# Altium footprint library connectors.PcbLib: 256 footprints (part 12 of 16)
Each footprint in its own frame and in the unit in brackets; x right, y up, seen from the top. Pads: shape width x height; smd on the part's side, far side on the other; paste and mask are expansions set on the pad; w line width, h text height; cw(c..) or ccw(c..) is an arc to the next point about the centre after c.
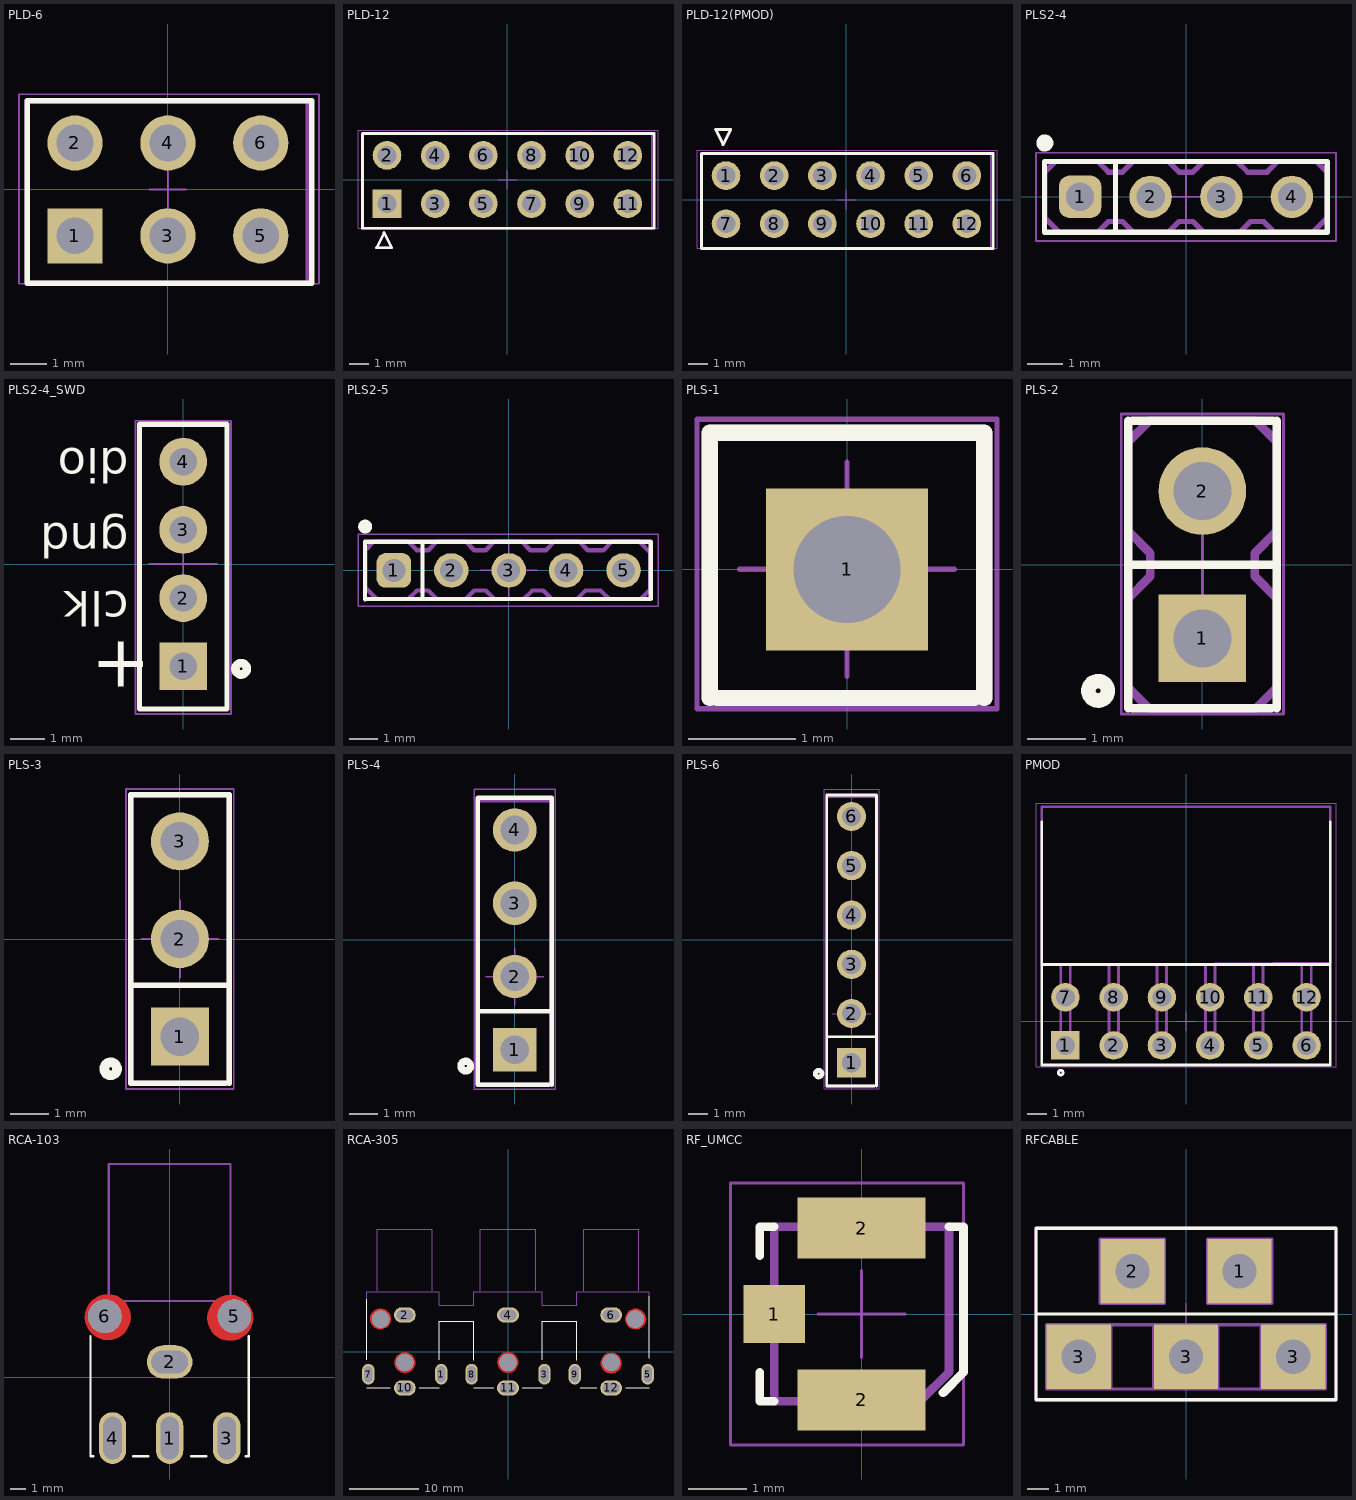
[diagram p11: the footprints below, top view; thin cyan lines are the x and y axes]

## PLD-6 [mm] "Разъем"
height 5
pads (6):
  rect 1.51x1.51 hole 1: 1(-2.54,-1.27)
  round 1.51 hole 1: 2(-2.54,1.27) 3(0,-1.27) 4(0,1.27) 5(2.54,-1.27) 6(2.54,1.27)
Top Overlay:
  lines w0.15: -3.84,-2.57 -3.84,2.43 3.93,2.43 3.93,-2.57 -3.84,-2.57
TopAssy 13:
  lines w0.15: -3.84,-2.57 3.83,-2.57 3.83,2.43 -3.84,2.43 -3.84,-2.57 ; -2.945,-1.675 -2.945,-0.875 -2.17,-0.875 -2.17,-1.675 -2.945,-1.675
TopCourt 15:
  lines w0.05: -0.5,0 0.5,0 ; 0,-0.5 0,0.5 ; -4.07,-2.575 -4.07,2.6 4.13,2.6 4.13,-2.575 -4.07,-2.575
3D body "PLD4.STEP": height 10.1, standoff -1.5, extent -1.27,-2.54 3.81,2.54
3D body "PLD4.STEP": height 10.1, standoff -1.5, extent -3.81,-2.54 1.27,2.54

## PLD-12 [mm] "Разъем"
height 5
pads (12):
  rect 1.51x1.51 hole 1: 1(-6.35,-1.27)
  round 1.51 hole 1: 2(-6.35,1.27) 3(-3.81,-1.27) 4(-3.81,1.27) 5(-1.27,-1.27) 6(-1.27,1.27) 7(1.27,-1.27) 8(1.27,1.27) 9(3.81,-1.27) 10(3.81,1.27) 11(6.35,-1.27) 12(6.35,1.27)
Top Overlay:
  lines w0.15: -7.65,-2.57 -7.65,2.43 7.74,2.43 7.74,-2.57 -7.65,-2.57 ; -6.9,-3.6 -6.5,-2.8 -6.1,-3.6 -6.9,-3.6
TopAssy 13:
  lines w0.15: -7.65,-2.57 7.64,-2.57 7.64,2.43 -7.65,2.43 -7.65,-2.57 ; -6.9,-3.6 -6.5,-2.8 -6.1,-3.6 -6.9,-3.6 ; -6.755,-1.675 -6.755,-0.875 -5.98,-0.875 -5.98,-1.675 -6.755,-1.675
TopCourt 15:
  lines w0.05: -0.5,0 0.5,0 ; 0,-0.5 0,0.5 ; -7.88,-2.575 -7.88,2.6 7.94,2.6 7.94,-2.575 -7.88,-2.575
3D body "PLD-12-2.54mm.STEP": height 8.54, standoff -3, extent -7.62,-2.54 7.62,2.54

## PLD-12(PMOD) [mm] "Разъем"
height 5
pads (12):
  round 1.51 hole 1: 1(-6.35,1.27) 2(-3.81,1.27) 3(-1.27,1.27) 4(1.27,1.27) 5(3.81,1.27) 6(6.35,1.27) 7(-6.35,-1.27) 8(-3.81,-1.27) 9(-1.27,-1.27) 10(1.27,-1.27) 11(3.81,-1.27) 12(6.35,-1.27)
Top Overlay:
  lines w0.15: -7.65,-2.57 7.74,-2.57 7.74,2.43 -7.65,2.43 -7.65,-2.57 ; -6.9,3.7 -6.1,3.7 -6.5,2.9 -6.9,3.7
TopAssy 13:
  lines w0.15: -7.65,-2.57 -7.65,2.43 7.64,2.43 7.64,-2.57 -7.65,-2.57 ; -6.9,3.7 -6.1,3.7 -6.5,2.9 -6.9,3.7 ; -6.755,-1.675 -5.98,-1.675 -5.98,-0.875 -6.755,-0.875 -6.755,-1.675
TopCourt 15:
  lines w0.05: -0.5,0 0.5,0 ; 0,-0.5 0,0.5 ; -7.88,-2.575 7.94,-2.575 7.94,2.6 -7.88,2.6 -7.88,-2.575
3D body "PLD-12-2.54mm.STEP": height 8.54, standoff -3, extent -7.62,-2.54 7.62,2.54

## PLS2-4 [mm]
height 2.1
pads (4):
  rrect50% 1.2x1.2 hole 0.8: 1(-3,0)
  round 1.2 hole 0.8: 2(-1,0) 3(1,0) 4(3,0)
Top Overlay:
  circle w0.15: c-4,1.525 r0.079
  circle w0.15: c-4,1.525 r0.168
  lines w0.15: -4.008,-1.008 -4.008,0.992 ; -4.008,-1 4,-1 4,1 -4.008,1 ; -2,-1 -2,1 -2.05,1 -1.975,1
TopAssy 13:
  lines w0.15: -4,-0.6 -3.6,-1 -2.5,-1 -2.2,-0.7 -1.8,-0.7 -1.5,-1 -0.5,-1 -0.2,-0.7 0.2,-0.7 0.5,-1 1.525,-1 1.825,-0.7 2.2,-0.7 2.5,-1 3.6,-1 4,-0.6 4,0.7 3.7,1 2.6,1 2.3,0.7 1.75,0.7 1.45,1 0.5,1 0.2,0.7 -0.2,0.7 -0.5,1 -1.5,1 -1.8,0.7 -2.2,0.7 -2.5,1 -3.7,1 -4,0.7 -4,-0.6 ; -3.2,-0.2 -2.8,-0.2 -2.8,0.2 -3.2,0.2 -3.2,-0.2 ; -1.2,-0.2 -0.8,-0.2 -0.8,0.2 -1.2,0.2 -1.2,-0.2 ; 0.8,-0.2 1.2,-0.2 1.2,0.2 0.8,0.2 0.8,-0.2 ; 2.8,-0.2 3.2,-0.2 3.2,0.2 2.8,0.2 2.8,-0.2
TopCourt 15:
  lines w0.05: -1,0 1,0 ; 0,-1 0,1 ; -4.25,-1.25 -4.25,1.25 4.25,1.25 4.25,-1.25 -4.25,-1.25
3D body "User Library-pls2-4_asm.STEP": height 6.1, standoff -2.7, extent -4,-1 4,1

## PLS2-4_SWD [mm]
pads (4):
  rect 1.4x1.4 hole 0.8: 1(0,-3)
  round 1.4 hole 0.8: 2(0,-1) 3(0,1) 4(0,3)
Top Overlay:
  circle w0.25: c1.7,-3.075 r0.168
  lines w0.15: -1.281,-4.25 1.281,-4.25 1.281,4.1 -1.281,4.1 -1.281,-4.25
  text "clk" at -1.6,-0.8 h1
  text "dio" at -1.6,3.4 h1
  text "gnd" at -1.6,1.2 h1
  text "+" at -2.7,-3.6 h1.52
TopAssy 13:
TopCourt 15:
  lines w0.05: -1,0 1,0 ; 0,-1 0,1 ; -1.4,-4.4 1.4,-4.4 1.4,4.2 -1.4,4.2 -1.4,-4.4
3D body "User Library-pls2-4_asm.STEP": height 6, standoff -2.8, extent -1,-4 1,4

## PLS2-5 [mm]
height 2.1
pads (5):
  rrect50% 1.2x1.2 hole 0.8: 1(-4,0)
  round 1.2 hole 0.8: 2(-2,0) 3(0,0) 4(2,0) 5(4,0)
Top Overlay:
  circle w0.15: c-5,1.525 r0.079
  circle w0.15: c-5,1.525 r0.168
  lines w0.15: -5.008,-1.008 -5.008,0.992 ; -5.008,-1 4.95,-1 4.95,1 -5.008,1 ; -3,-1 -3,1 -3.05,1 -2.975,1
TopAssy 13:
  lines w0.15: -5,-0.6 -4.6,-1 -3.5,-1 -3.2,-0.7 -2.8,-0.7 -2.5,-1 -1.5,-1 -1.2,-0.7 -0.8,-0.7 -0.5,-1 0.525,-1 0.825,-0.7 1.2,-0.7 1.5,-1 2.375,-1 2.675,-0.7 3.2,-0.7 3.5,-1 4.6,-1 4.925,-0.675 4.925,0.625 4.55,1 3.6,1 3.3,0.7 2.75,0.7 2.45,1 1.6,1 1.3,0.7 0.75,0.7 0.45,1 -0.5,1 -0.8,0.7 -1.2,0.7 -1.5,1 -2.5,1 -2.8,0.7 -3.2,0.7 -3.5,1 -4.7,1 -5,0.7 -5,-0.6 ; -4.2,-0.2 -3.8,-0.2 -3.8,0.2 -4.2,0.2 -4.2,-0.2 ; -2.2,-0.2 -1.8,-0.2 -1.8,0.2 -2.2,0.2 -2.2,-0.2 ; -0.2,-0.2 0.2,-0.2 0.2,0.2 -0.2,0.2 -0.2,-0.2 ; 1.8,-0.2 2.2,-0.2 2.2,0.2 1.8,0.2 1.8,-0.2 ; 3.8,-0.2 3.8,0.2 4.2,0.2 4.2,-0.2 3.8,-0.2
TopCourt 15:
  lines w0.05: -1,0 1,0 ; 0,-1 0,1 ; -5.25,-1.25 -5.25,1.25 5.2,1.25 5.2,-1.25 -5.25,-1.25
3D body "User Library-pls2-5_asm-1.STEP": height 6.1, standoff -2.7, extent -5,-1 5,1

## PLS-1 [mm]
pads (1):
  rect 1.51x1.51 hole 1: 1(0,0)
Top Overlay:
  lines w0.15: -1.281,-1.2 -1.281,1.275 1.281,1.275 1.281,-1.2 ; -1.211,-1.2 1.184,-1.2
TopAssy 13:
  lines w0.15: -1.281,-1.2 -1.281,1.275 1.281,1.275 1.281,-1.2 -1.281,-1.2 ; -0.5,-0.425 0.275,-0.425 0.275,0.375 -0.5,0.375 -0.5,-0.425
TopCourt 15:
  lines w0.05: -1,0 1,0 ; 0,-1 0,1 ; -1.4,-1.3 1.4,-1.3 1.4,1.4 -1.4,1.4 -1.4,-1.3
3D body "User Library-PLS-1.step": height 8.54, standoff -2.9, extent -1.27,-1.27 1.27,1.27

## PLS-2 [mm]
pads (2):
  rect 1.51x1.51 hole 1: 1(0,-1.27)
  round 1.51 hole 1: 2(0,1.27)
Top Overlay:
  circle w0.25: c-1.8,-2.175 r0.168
  lines w0.15: -1.281,-2.475 -1.281,2.485 ; -1.211,-2.475 1.184,-2.475 ; -1.211,0 1.221,0 ; -1.211,2.485 1.221,2.485 ; 1.281,-2.475 1.281,2.485
TopAssy 13:
  lines w0.15: -1.281,-2.119 -0.925,-2.475 0.925,-2.475 1.281,-2.119 1.281,-0.581 0.9,-0.2 0.9,0.2 1.281,0.581 1.281,2.119 0.915,2.485 -0.915,2.485 -1.281,2.119 -1.281,0.581 -0.9,0.2 -0.9,-0.2 -1.281,-0.581 -1.281,-2.119 ; -0.2,-1.5 0.2,-1.5 0.2,-1.1 -0.2,-1.1 -0.2,-1.5 ; -0.2,1.1 -0.2,1.5 0.2,1.5 0.2,1.1 -0.2,1.1
TopCourt 15:
  lines w0.05: -1,0 1,0 ; 0,-1 0,1 ; -1.4,-2.575 1.4,-2.575 1.4,2.6 -1.4,2.6 -1.4,-2.575
3D body "User Library-PLS-2.step": height 8.64, standoff -2.9, extent -1.29,-2.54 1.25,2.54

## PLS-3 [mm]
pads (3):
  rect 1.51x1.51 hole 1: 1(0,-2.54)
  round 1.51 hole 1: 2(0,0) 3(0,2.54)
Top Overlay:
  circle w0.25: c-1.8,-3.375 r0.168
  lines w0.15: -1.281,-3.75 -1.281,3.75 1.221,3.75 ; -1.281,-1.2 1.281,-1.2 ; -1.211,-3.75 1.184,-3.75 ; 1.281,-3.75 1.281,3.75
TopAssy 13:
  lines w0.15: -1.281,-3.75 -1.281,3.75 ; -1.211,-3.75 1.184,-3.75 ; -1.211,3.75 1.221,3.75 ; 1.281,-3.75 1.281,3.75 ; -0.4,-2.925 0.375,-2.925 0.375,-2.125 -0.4,-2.125 -0.4,-2.925
TopCourt 15:
  lines w0.05: -1,0 1,0 ; 0,-1 0,1 ; -1.4,-3.9 -1.4,3.9 1.4,3.9 1.4,-3.9 -1.4,-3.9
3D body "PLS3.STEP": height 10.1, standoff -1.5, extent -1.27,-3.77 1.27,3.85

## PLS-4 [mm]
pads (4):
  rect 1.51x1.51 hole 1: 1(0,-3.81)
  round 1.51 hole 1: 2(0,-1.27) 3(0,1.27) 4(0,3.81)
Top Overlay:
  circle w0.25: c-1.7,-4.375 r0.168
  lines w0.15: -1.281,-5.02 -1.281,4.93 1.281,4.93 1.281,-5.02 ; -1.281,-2.47 1.281,-2.47 ; -1.211,-5.02 1.184,-5.02
TopAssy 13:
  lines w0.15: -1.281,-5.02 -1.281,4.83 1.281,4.83 1.281,-5.02 ; -1.211,-5.02 1.184,-5.02 ; -0.4,-4.195 0.375,-4.195 0.375,-3.395 -0.4,-3.395 -0.4,-4.195
TopCourt 15:
  lines w0.05: -1,-1.27 1,-1.27 ; 0,-2.27 0,-0.27 ; -1.4,-5.17 -1.4,5.23 1.4,5.23 1.4,-5.17 -1.4,-5.17
3D body "User Library-PLS-1.step": height 8.54, standoff -2.9, extent -1.27,2.54 1.27,5.08
3D body "User Library-PLS-1.step": height 8.54, standoff -2.9, extent -1.27,0 1.27,2.54
3D body "User Library-PLS-1.step": height 8.54, standoff -2.9, extent -1.27,-2.54 1.27,0
3D body "User Library-PLS-1.step": height 8.54, standoff -2.9, extent -1.27,-5.08 1.27,-2.54

## PLS-6 [mm]
pads (6):
  rect 1.51x1.51 hole 1: 1(0,-6.36)
  round 1.51 hole 1: 2(0,-3.82) 3(0,-1.28) 4(0,1.26) 5(0,3.82) 6(0,6.36)
Top Overlay:
  circle w0.25: c-1.7,-6.925 r0.168
  lines w0.15: -1.281,-7.57 -1.281,7.48 1.281,7.48 1.281,-7.57 ; -1.281,-5.02 1.281,-5.02 ; -1.211,-7.57 1.184,-7.57
TopAssy 13:
  lines w0.15: -1.281,-7.57 -1.281,7.38 1.281,7.38 1.281,-7.57 ; -1.211,-7.57 1.184,-7.57 ; -0.4,-6.745 0.375,-6.745 0.375,-5.945 -0.4,-5.945 -0.4,-6.745
TopCourt 15:
  lines w0.05: -1,-3.82 1,-3.82 ; 0,-4.82 0,-2.82 ; -1.4,-7.72 -1.4,7.78 1.4,7.78 1.4,-7.72 -1.4,-7.72
3D body "User Library-PLS-1.step": height 8.54, standoff -2.9, extent -1.27,5.09 1.27,7.63
3D body "User Library-PLS-1.step": height 8.54, standoff -2.9, extent -1.27,2.55 1.27,5.09
3D body "User Library-PLS-1.step": height 8.54, standoff -2.9, extent -1.27,-0.01 1.27,2.53
3D body "User Library-PLS-1.step": height 8.54, standoff -2.9, extent -1.27,-2.55 1.27,-0.01
3D body "User Library-PLS-1.step": height 8.54, standoff -2.9, extent -1.27,-5.09 1.27,-2.55
3D body "User Library-PLS-1.step": height 8.54, standoff -2.9, extent -1.27,-7.63 1.27,-5.09

## PMOD [mm] "Samtec -SSW-106-02-T-D-RA (PBD-12R)"
pads (12):
  rect 1.5x1.5 hole 1: 1(-6.35,-1.27)
  round 1.5 hole 1: 2(-3.81,-1.27) 3(-1.27,-1.27) 4(1.27,-1.27) 5(3.81,-1.27) 6(6.35,-1.27) 7(-6.35,1.27) 8(-3.81,1.27) 9(-1.27,1.27) 10(1.27,1.27) 11(3.81,1.27) 12(6.35,1.27)
Top Overlay:
  circle w0.15: c-6.6,-2.7 r0.125
  lines w0.15: -7.6,10.5 -7.6,3 ; 7.6,10.5 7.6,3 ; -7.6,3 -7.6,-2.3 7.6,-2.3 7.6,3 ; -7.6,3 7.6,3
TopAssy 13:
  lines w0.15: -6.6,-1.1 -6.1,-1.1 ; -6.6,1 -6.1,1 ; -6.6,1.5 -6.1,1.5 ; -6.6,2.954 -6.6,-1.6 -6.1,-1.6 -6.1,2.968 ; -4.06,-1.1 -3.56,-1.1 ; -4.06,1 -3.56,1 ; -4.06,1.5 -3.56,1.5 ; -4.06,2.954 -4.06,-1.6 -3.56,-1.6 -3.56,2.968 ; -1.52,-1.1 -1.02,-1.1 ; -1.52,1 -1.02,1 ; -1.52,1.5 -1.02,1.5 ; -1.52,2.954 -1.52,-1.6 -1.02,-1.6 -1.02,2.968 ; 1.02,-1.1 1.52,-1.1 ; 1.02,1 1.52,1 ; 1.02,1.5 1.52,1.5 ; 1.02,2.954 1.02,-1.6 1.52,-1.6 1.52,2.968 ; 3.56,-1.1 4.06,-1.1 ; 3.56,1 4.06,1 ; 3.56,1.5 4.06,1.5 ; 3.56,2.954 3.56,-1.6 4.06,-1.6 4.06,2.968 ; 6.1,-1.1 6.6,-1.1 ; 6.1,1 6.6,1 ; 6.1,1.5 6.6,1.5 ; 6.1,2.954 6.1,-1.6 6.6,-1.6 6.6,2.968 ; -7.6,2.954 -7.6,11.3 7.6,11.3 7.6,3.087 -7.6,2.954
TopCourt 15:
  lines w0.05: -0.5,0 0.5,0 ; 0,-0.5 0,0.5 ; -7.9,-2.4 -7.9,11.5 7.9,11.5 7.9,-2.4 -7.9,-2.4
3D body "PBD-12R.step": height 5.01, standoff -2.99, extent -7.62,-1.57 7.62,11.43

## RCA-103 [mm]
pads (6):
  oval 1.8x3.4 hole 1.2 slot 2.8 at 90 deg: 1(0,-4) 3(3.75,-4) 4(-3.75,-4)
  oval 3x2.2 hole 1.5 slot 2.4 at 0 deg: 2(0,1)
  round 2.2 hole 2.2 unplated: 5(4.25,4) 6(-4.25,4)
Top Layer:
  pour cut-out: 5.484,3.893 5.455,4.187 5.37,4.47 5.23,4.73 5.043,4.959 4.815,5.146 4.554,5.285 4.271,5.371 3.977,5.4 3.683,5.371 3.4,5.285 3.14,5.146 2.911,4.959 2.724,4.73 2.585,4.47 2.499,4.187 2.47,3.893 2.499,3.599 2.585,3.316 2.724,3.056 2.911,2.827 3.14,2.64 3.4,2.5 3.683,2.415 3.977,2.386 4.271,2.415 4.554,2.5 4.815,2.64 5.043,2.827 5.23,3.056 5.37,3.316 5.455,3.599
  pour cut-out: -2.555,3.947 -2.584,4.241 -2.67,4.524 -2.809,4.784 -2.997,5.013 -3.225,5.2 -3.486,5.339 -3.769,5.425 -4.063,5.454 -4.357,5.425 -4.639,5.339 -4.9,5.2 -5.128,5.013 -5.316,4.784 -5.455,4.524 -5.541,4.241 -5.57,3.947 -5.541,3.653 -5.455,3.37 -5.316,3.109 -5.128,2.881 -4.9,2.694 -4.639,2.554 -4.357,2.468 -4.063,2.44 -3.769,2.468 -3.486,2.554 -3.225,2.694 -2.997,2.881 -2.809,3.109 -2.67,3.37 -2.584,3.653
Top Overlay:
  lines w0.15: -5.2,2.7 -5.2,-5.2 -5,-5.2 ; -2.4,-5.2 -1.4,-5.2 ; 1.4,-5.2 2.4,-5.2 ; 5,-5.2 5.2,-5.2 5.2,2.7
TopAssy 13:
  lines w0.15: -5,5 5,5 ; -4,5 -4,14 4,14 4,5
3D body "CUI-RCJ-043.step": height 11.5, standoff -4, extent -5,-5.2 5,14.3

## RCA-305 [mm]
pads (17):
  oval 1.8x3 hole 1.2 slot 2.3 at 90 deg: 1(-9.7,-3.3) 3(5.3,-3.3) 5(20.3,-3.3) 7(-20.3,-3.3) 8(-5.3,-3.3) 9(9.7,-3.3)
  oval 3.2x2.2 hole 1.5 slot 2.4 at 0 deg: 2(-15,5.3) 4(0,5.3) 6(15,5.3) 10(-15,-5.3) 11(0,-5.3) 12(15,-5.3)
  round 2.5 hole 2.5 unplated: ""(-18.5,4.7) ""(-15,-1.6) ""(0,-1.6) ""(15,-1.6) ""(18.5,4.7)
Top Layer:
  pour cut-out: -17.028,4.735 -17.057,5.029 -17.143,5.312 -17.282,5.573 -17.47,5.801 -17.698,5.989 -17.959,6.128 -18.241,6.214 -18.535,6.243 -18.829,6.214 -19.112,6.128 -19.373,5.989 -19.601,5.801 -19.789,5.573 -19.928,5.312 -20.014,5.029 -20.043,4.735 -20.014,4.441 -19.928,4.159 -19.789,3.898 -19.601,3.67 -19.373,3.482 -19.112,3.343 -18.829,3.257 -18.535,3.228 -18.241,3.257 -17.959,3.343 -17.698,3.482 -17.47,3.67 -17.282,3.898 -17.143,4.159 -17.057,4.441
  pour cut-out: -13.486,-1.623 -13.515,-1.329 -13.6,-1.046 -13.74,-0.785 -13.927,-0.557 -14.156,-0.37 -14.416,-0.23 -14.699,-0.145 -14.993,-0.116 -15.287,-0.145 -15.57,-0.23 -15.83,-0.37 -16.059,-0.557 -16.246,-0.785 -16.385,-1.046 -16.471,-1.329 -16.5,-1.623 -16.471,-1.917 -16.385,-2.2 -16.246,-2.46 -16.059,-2.689 -15.83,-2.876 -15.57,-3.015 -15.287,-3.101 -14.993,-3.13 -14.699,-3.101 -14.416,-3.015 -14.156,-2.876 -13.927,-2.689 -13.74,-2.46 -13.6,-2.2 -13.515,-1.917
  pour cut-out: 1.484,-1.593 1.455,-1.298 1.369,-1.016 1.23,-0.755 1.043,-0.527 0.814,-0.339 0.554,-0.2 0.271,-0.114 -0.023,-0.085 -0.317,-0.114 -0.6,-0.2 -0.861,-0.339 -1.089,-0.527 -1.276,-0.755 -1.416,-1.016 -1.501,-1.298 -1.53,-1.593 -1.501,-1.887 -1.416,-2.169 -1.276,-2.43 -1.089,-2.658 -0.861,-2.846 -0.6,-2.985 -0.317,-3.071 -0.023,-3.1 0.271,-3.071 0.554,-2.985 0.814,-2.846 1.043,-2.658 1.23,-2.43 1.369,-2.169 1.455,-1.887
  pour cut-out: 20.06,4.707 20.031,5.001 19.945,5.284 19.806,5.545 19.619,5.773 19.39,5.96 19.13,6.1 18.847,6.186 18.553,6.214 18.259,6.186 17.976,6.1 17.716,5.96 17.487,5.773 17.3,5.545 17.16,5.284 17.075,5.001 17.046,4.707 17.075,4.413 17.16,4.13 17.3,3.87 17.487,3.641 17.716,3.454 17.976,3.315 18.259,3.229 18.7,3.2 18.847,3.229 19.13,3.315 19.39,3.454 19.619,3.641 19.806,3.87 19.945,4.13 20.031,4.413
  pour cut-out: 16.501,-1.678 16.472,-1.384 16.387,-1.101 16.247,-0.841 16.06,-0.613 15.831,-0.425 15.571,-0.286 15.288,-0.2 14.994,-0.171 14.7,-0.2 14.417,-0.286 14.157,-0.425 13.928,-0.613 13.741,-0.841 13.602,-1.101 13.516,-1.384 13.487,-1.678 13.516,-1.972 13.602,-2.255 13.741,-2.516 13.928,-2.744 14.157,-2.932 14.417,-3.071 14.7,-3.157 14.994,-3.186 15.288,-3.157 15.571,-3.071 15.831,-2.932 16.06,-2.744 16.247,-2.516 16.387,-2.255 16.472,-1.972
Top Overlay:
  lines w0.15: -20.5,-5.3 -17.1,-5.3 ; -20.5,-1.2 -20.5,7.6 ; -12.9,-5.3 -10,-5.3 ; -10,-1.2 -10,4.4 -5,4.4 -5,-1.3 ; -5,-5.3 -2.1,-5.3 ; 2.1,-5.3 5,-5.3 ; 5,-1.2 5,4.4 10,4.4 10,-1.3 ; 10.5,-5.3 12.9,-5.3 ; 17.1,-5.3 20.5,-5.3 ; 20.5,-1 20.5,8
TopAssy 13:
  lines w0.15: -20.5,7.6 -20.5,8.7 -10,8.7 -10,6.7 -5,6.7 -5,8.7 5,8.7 5,6.7 10,6.7 10,8.7 20.5,8.7 20.5,8 ; -19,8.8 -19,17.8 -11,17.8 -11,8.8 ; -4,8.8 -4,17.8 4,17.8 4,8.8 ; 11,8.8 11,17.8 19,17.8 19,8.8

## RF_UMCC [mm] "SMT Ulta Miniature Coaxial"
height 1.25
pads (3):
  rect 1.05x1 smd: 1(-1.5,0)
  rect 2.2x1.05 smd: 2(0,-1.475) 2(0,1.475)
Top Overlay:
  lines w0.15: -1.75,-1 -1.75,-1.5 -1.5,-1.5 ; -1.75,1 -1.75,1.5 -1.5,1.5 ; 1.4,-1.35 1.75,-1 1.75,1.5 1.5,1.5
TopAssy 13:
  lines w0.15: -1.5,-1.5 1,-1.5 1.5,-1 1.5,1.5 -1.5,1.5 -1.5,-1.5
TopCourt 15:
  lines w0.05: -0.75,0 0.75,0 ; 0,-0.75 0,0.75 ; -2.25,-2.25 -2.25,2.25 1.75,2.25 1.75,-2.25 -2.25,-2.25
3D body "User Library-0734120110 - Molex - UMC Antenna Connector SMT.step": height 1.3, standoff 0, extent -1.55,-1.5 1.55,1.5

## RFCABLE [mm] "контакты под пайку кабеля"
height 1
pads (5):
  rect 3x3 hole 1.6: 1(2.5,2) 2(-2.5,2) 3(-5,-2) 3(0,-2) 3(5,-2)
Top Overlay:
  lines w0.15: -7,0 7,0 1,0 ; -7,-4 -7,4 7,4 7,-4 -7,-4
TopAssy 13:
  lines w0.15: -3.5,-3.5 -3.5,-0.5 ; -1.5,-3.5 -1.5,-0.5 ; 1.5,-3.5 1.5,-0.5 ; 3.5,-3.5 3.5,-0.5 ; -7,-4 -7,4 7,4 7,-4 -7,-4 ; -6.5,-3.5 -6.5,-0.5 6.5,-0.5 6.5,-3.5 -6.5,-3.5 ; -4,0.5 -1,0.5 -1,3.5 -4,3.5 -4,0.5 ; 1,0.5 1,3.5 4,3.5 4,0.5 1,0.5
TopCourt 15:
  lines w0.05: -0.5,0 0.5,0 ; 0,-0.5 0,0.5 ; -7,-4 7,-4 7,4 -7,4 -7,-4